# Altium footprint library EwgConnectors.PcbLib: 125 footprints (part 1 of 8)
Each footprint in its own frame and in the unit in brackets; x right, y up, seen from the top. Pads: shape width x height; smd on the part's side, far side on the other; paste and mask are expansions set on the pad; w line width, h text height; cw(c..) or ccw(c..) is an arc to the next point about the centre after c.
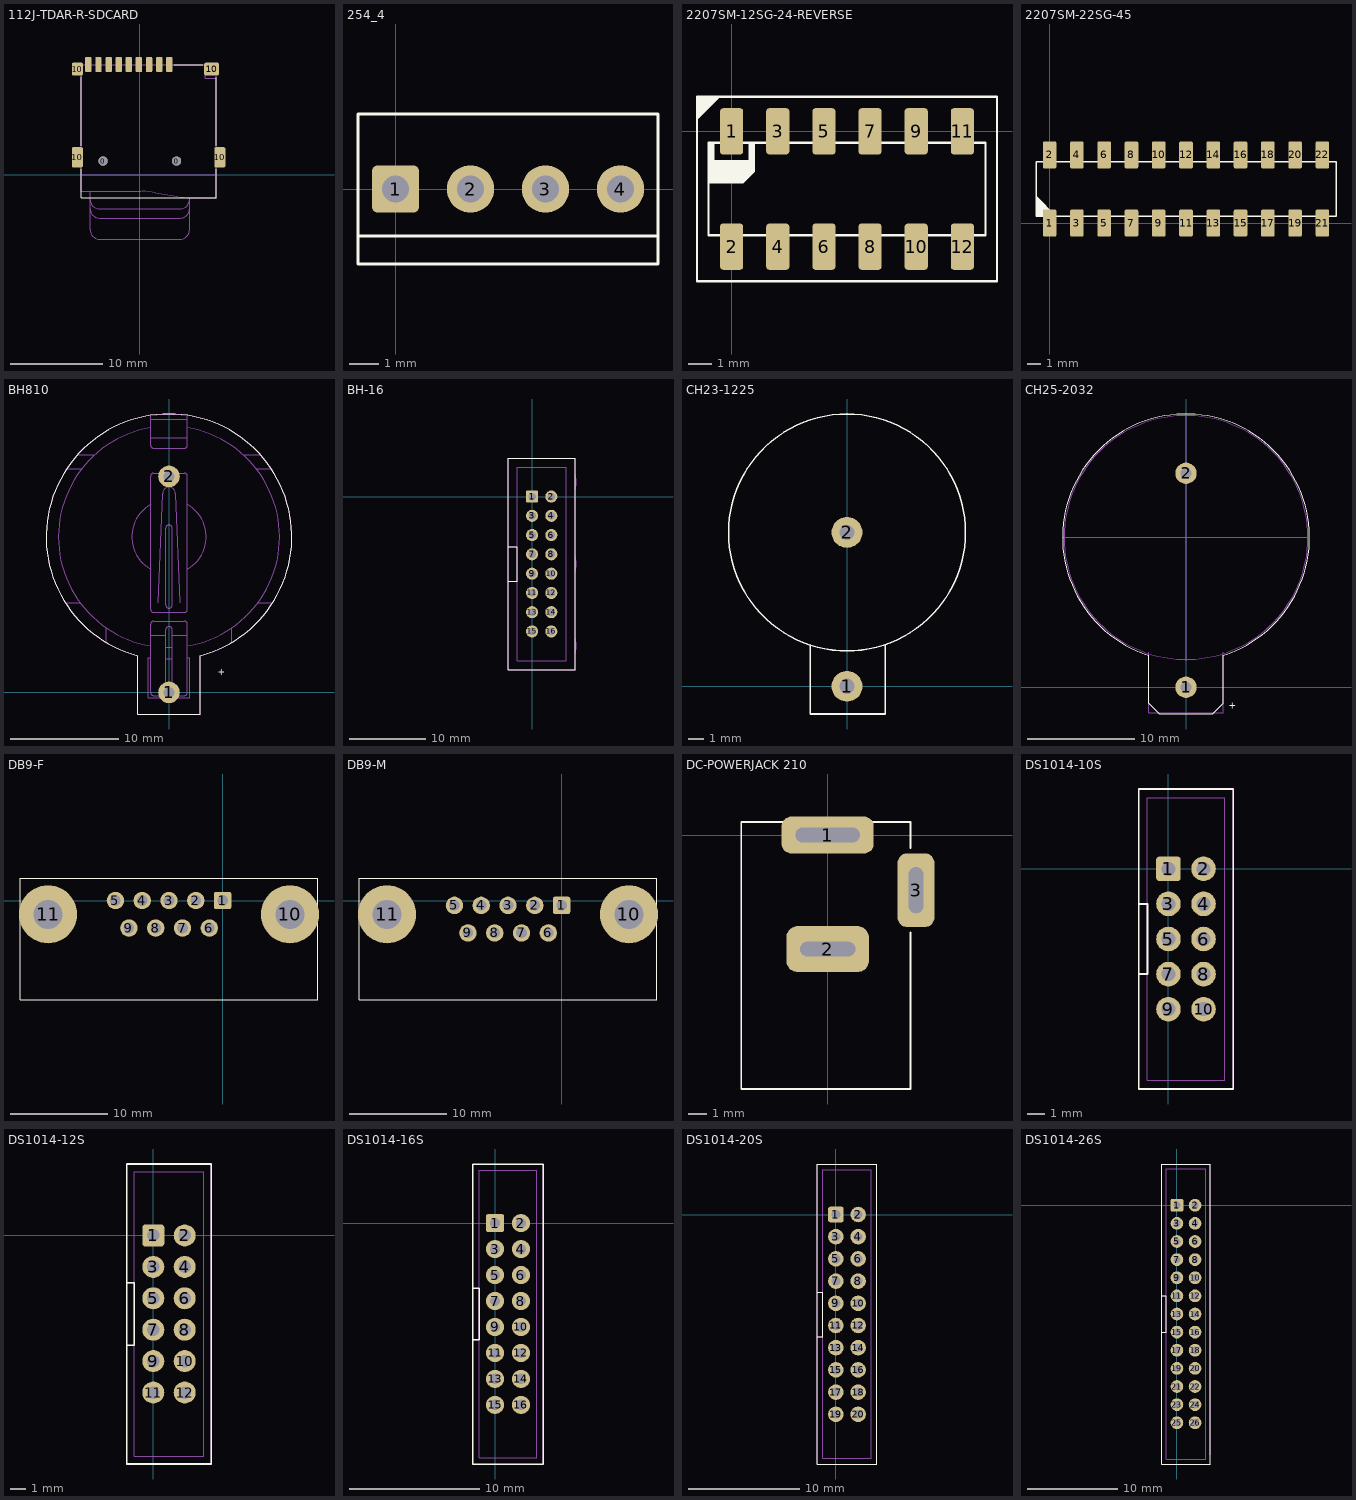
[diagram p0: the footprints below, top view; thin cyan lines are the x and y axes]

## 112J-TDAR-R-SDCARD [mm]
pads (15):
  round 1 hole 1 unplated: 0(-4,1.5) 0(4,1.5)
  rrect25% 0.7x1.6 smd: 1(3.2,12) 2(2.1,12) 3(1,12) 4(-0.1,12) 5(-1.2,12) 6(-2.3,12) 7(-3.4,12) 8(-4.5,12) 9(-5.6,12)
  rrect25% 1.2x2.2 smd: 10(-6.8,1.9) 10(8.7,1.9)
  rrect25% 1.2x1.4 smd: 10(-6.8,11.5)
  rrect25% 1.6x1.4 smd: 10(7.8,11.5)
Top Overlay:
  lines w0.1: -6.4,0.65 -6.4,-2.5 8.3,-2.5 8.3,0.65 ; -6.4,3.15 -6.4,10.65 ; 3.7,12 6.85,12 ; 8.3,3.15 8.3,10.65
Mechanical 1:
  lines w0.005: -6.4,0 8.3,0
  lines w0.05: -6.6,11 -6.6,12 ; -6.45,0 -6.4,0 -6.4,-1.8 ; -6.4,1.1 -7.1,1.1 -7.1,1.9 -7.1,2.7 -6.4,2.7 ; -6.4,11 -7.1,11 -7.1,12 -6.4,12 ; -5.75,12 -5.75,12.5 -5.45,12.5 -5.45,12 -5.6,12 ; -5.4,-3.7 ccw(c-4.4,-3.7) -4.4,-4.7 4.4,-4.7 ccw(c4.4,-3.7) 5.4,-3.7 ; -5.4,-2.65 -5.4,-6 ccw(c-4.4,-6) -4.4,-7 0,-7 4.4,-7 ccw(c4.4,-6) 5.4,-6 5.4,-2.65 ; -4.65,12 -4.65,12.5 -4.35,12.5 -4.35,12 -4.5,12 ; -3.55,12 -3.55,12.5 -3.25,12.5 -3.25,12 -3.4,12 ; -2.45,12 -2.45,12.5 -2.15,12.5 -2.15,12 -2.3,12 ; -1.35,12 -1.35,12.5 -1.05,12.5 -1.05,12 -1.2,12 ; -0.25,12 -0.25,12.5 0.05,12.5 0.05,12 -0.1,12 ; 0.1,-1.8 -6.4,-1.8 ; 0.2,-1.8 cw(c0.205,-9.83) 1.75,-1.95 4,-2.35 ccw(c5.603,6.137) 5.6,-2.5 8.3,-2.5 8.3,10.5 7.1,10.5 7.1,11 ; 0.85,12 0.85,12.5 1.15,12.5 1.15,12 1,12 ; 0.95,12.5 0.95,12 ; 1.95,12 1.95,12.5 2.25,12.5 2.25,12 2.1,12 ; 3.05,12 3.05,12.5 3.35,12.5 3.35,12 3.2,12 ; 5.4,-2.5 5.4,-2.7 cw(c4.4,-2.7) 4.4,-3.7 -4.4,-3.7 cw(c-4.4,-2.7) -5.4,-2.7 -5.4,-2.5 -5.4,-1.8 -6.4,-1.8 ; 7.1,12 7.1,11 ; 7.35,11 7.35,12 ; 8.3,1.1 9,1.1 9,1.9 9,2.7 8.3,2.7 ; -6.4,-1.8 -6.4,12 ; -6.4,12 0.95,12 ; 0.95,12 8.3,12 8.3,11 7.1,11
3D body: height 1.85, standoff 0, extent -7.4,-2.525 9.3,12.275

## 254_4 [mm]
pads (4):
  rrect25% 1.6x1.6 hole 0.9: 1(0,0)
  round 1.6 hole 0.9: 2(2.54,0) 3(5.08,0) 4(7.62,0)
Top Overlay:
  lines w0.1: -1.27,-1.587 8.89,-1.587 ; -1.27,-2.54 -1.27,2.54 8.89,2.54 8.89,-2.54 -1.27,-2.54
Mechanical 1:
  lines w0.05: -1.27,-1.587 8.89,-1.587 ; -1.27,-2.54 -1.27,2.54 8.89,2.54 8.89,-2.54 -1.27,-2.54 ; -0.318,-0.318 -0.318,0.318 0.318,0.318 0.318,-0.318 -0.318,-0.318 ; 2.222,-0.318 2.222,0.318 2.857,0.318 2.857,-0.318 2.222,-0.318 ; 4.763,-0.318 4.763,0.318 5.397,0.318 5.397,-0.318 4.763,-0.318 ; 7.302,-0.318 7.302,0.318 7.938,0.318 7.938,-0.318 7.302,-0.318

## 2207SM-12SG-24-REVERSE [mm]
height 2.4
pads (12):
  rrect25% 1x2 smd: 1(0,0) 2(0,-5) 3(2,0) 4(2,-5) 5(4,0) 6(4,-5) 7(6,0) 8(6,-5) 9(8,0) 10(8,-5) 11(10,0) 12(10,-5)
Top Overlay:
  region: -0.75,-0.5 -0.75,-1.25 0.75,-1.25 0.75,-0.5 1,-0.5 1,-1.75 0.5,-2.25 -1,-2.25 -1,-0.5
  region: -1.5,0.5 -0.5,1.5 -1.5,1.5
  lines w0.1: -1.5,-6.5 -1.5,1.5 11.5,1.5 11.5,-6.5 -1.5,-6.5 ; -1,-4.5 11,-4.5 11,-0.5 -1,-0.5 -1,-4.5
3D body: height 2.4, standoff 0, extent -1,-5.55 11,0.55

## 2207SM-22SG-45 [mm]
height 4.5
pads (22):
  rrect25% 1x2 smd: 1(0,0) 2(0,5) 3(2,0) 4(2,5) 5(4,0) 6(4,5) 7(6,0) 8(6,5) 9(8,0) 10(8,5) 11(10,0) 12(10,5) 13(12,0) 14(12,5) 15(14,0) 16(14,5) 17(16,0) 18(16,5) 19(18,0) 20(18,5) 21(20,0) 22(20,5)
Top Overlay:
  region: -1,0.5 -1,2 0.5,0.5
  lines w0.1: -1,0.5 21,0.5 21,4.5 -1,4.5 -1,0.5
3D body: height 4.5, standoff 0, extent -1.075,-0.55 21.075,5.55

## BH810 [mm]
pads (2):
  round 2 hole 1: 1(0,0) 2(0,20)
Top Overlay:
  lines w0.1: -2.9,-2 -2.9,3.4 cw(c0,14.4) 2.9,3.4 2.9,-2 -2.9,-2
  text "+" at 4.5,1.6 h0.63
Mechanical 1:
  lines w0.05: -9.6,8.3 -8.2,8.3 ; -9.5,20.7 -8.1,20.7 ; -8.5,22 -6.9,22 ; -5.8,4.6 -5.8,6 ; -1.7,3.2 -1.9,3.2 -1.9,-0.5 1.9,-0.5 1.9,3.2 1.7,3.2 ; -1.7,4.3 cw(c0,14.4) -1.7,24.5 ; -1.7,5.3 -0.3,5.3 ; -1.7,11.4 cw(c0,14.4) -1.7,17.4 ; -1.7,23.6 1.7,23.6 ; -1.7,25.3 1.7,25.3 ; -1,8.3 -0.6,18.4 cw(c0,18.4) 0.6,18.4 1,8.3 ; -0.3,3.1 ccw(c0,14.4) 0.3,3.1 ; -0.3,4.2 ccw(c0,14.4) 0.3,4.2 ; 0.3,5.3 1.7,5.3 ; 1.7,4.3 ccw(c0,14.4) 1.7,24.5 ; 1.7,11.4 ccw(c0,14.4) 1.7,17.4 ; 5.8,4.6 5.8,6 ; 6.9,22 8.5,22 ; 8.1,20.7 9.5,20.7 ; 8.2,8.3 9.6,8.3 ; -2.9,-2 0,-2 2.9,-2 2.9,3.4 ccw(c0,14.4) -2.9,3.4 -2.9,-2 ; -1.7,0 ccw(c-1.4,0) -1.4,-0.3 1.4,-0.3 ccw(c1.4,0) 1.7,0 1.7,6.3 ccw(c1.4,6.3) 1.4,6.6 -1.4,6.6 ccw(c-1.4,6.3) -1.7,6.3 -1.7,0 ; -1.7,7.7 ccw(c-1.4,7.7) -1.4,7.4 1.4,7.4 ccw(c1.4,7.7) 1.7,7.7 1.7,20 ccw(c1.4,20) 1.4,20.3 -1.4,20.3 ccw(c-1.4,20) -1.7,20 -1.7,7.7 ; -1.7,22.9 ccw(c-1.4,22.9) -1.4,22.6 1.4,22.6 ccw(c1.4,22.9) 1.7,22.9 1.7,25.6 ccw(c0,14.4) -1.7,25.6 -1.7,22.9 ; -0.3,0.4 ccw(c0,0.4) 0.3,0.4 0.3,5.8 ccw(c0,5.8) -0.3,5.8 -0.3,0.4 ; -0.3,8.1 ccw(c0,8.1) 0.3,8.1 0.3,15.2 ccw(c0,15.2) -0.3,15.2 -0.3,8.1

## BH-16 [mm]
pads (16):
  rrect25% 1.6x1.6 hole 1: 1(0,0)
  round 1.6 hole 1: 2(2.54,0) 3(0,-2.54) 4(2.54,-2.54) 5(0,-5.08) 6(2.54,-5.08) 7(0,-7.62) 8(2.54,-7.62) 9(0,-10.16) 10(2.54,-10.16) 11(0,-12.7) 12(2.54,-12.7) 13(0,-15.24) 14(2.54,-15.24) 15(0,-17.78) 16(2.54,-17.78)
Top Overlay:
  lines w0.1: -3.175,-11.193 -1.984,-11.193 -1.984,-6.589 -3.175,-6.589 ; -3.175,-22.86 -3.175,5.08 5.715,5.08 5.715,-22.86 -3.175,-22.86
Mechanical 1:
  lines w0.05: -3.175,-11.192 -1.984,-11.193 ; -3.175,-6.588 -1.984,-6.589 ; 5.715,-20.955 ccw(c-3.175,-19.685) 5.715,-18.415 ; 5.715,-10.16 ccw(c-3.175,-8.89) 5.715,-7.62 ; 5.715,0.635 ccw(c-3.175,1.905) 5.715,3.175 ; -3.175,-22.86 -3.175,5.08 5.715,5.08 5.715,-22.86 -3.175,-22.86 ; -1.984,-21.671 -1.984,3.89 4.525,3.89 4.525,-21.671 -1.984,-21.671 ; -0.318,-18.098 -0.318,-17.462 0.318,-17.462 0.318,-18.098 -0.318,-18.098 ; -0.318,-15.557 -0.318,-14.922 0.318,-14.922 0.318,-15.557 -0.318,-15.557 ; -0.318,-13.018 -0.318,-12.383 0.318,-12.383 0.318,-13.018 -0.318,-13.018 ; -0.318,-10.477 -0.318,-9.842 0.318,-9.842 0.318,-10.477 -0.318,-10.477 ; -0.318,-7.938 -0.318,-7.302 0.318,-7.302 0.318,-7.938 -0.318,-7.938 ; -0.318,-5.397 -0.318,-4.763 0.318,-4.763 0.318,-5.397 -0.318,-5.397 ; -0.318,-2.857 -0.318,-2.222 0.318,-2.222 0.318,-2.857 -0.318,-2.857 ; -0.318,-0.318 -0.318,0.318 0.318,0.318 0.318,-0.318 -0.318,-0.318 ; 2.222,-18.098 2.222,-17.462 2.857,-17.462 2.857,-18.098 2.222,-18.098 ; 2.222,-15.557 2.857,-15.557 2.857,-14.922 2.222,-14.922 2.222,-15.557 ; 2.222,-13.018 2.222,-12.383 2.857,-12.383 2.857,-13.018 2.222,-13.018 ; 2.222,-10.477 2.857,-10.477 2.857,-9.842 2.222,-9.842 2.222,-10.477 ; 2.222,-7.938 2.857,-7.938 2.857,-7.302 2.222,-7.302 2.222,-7.938 ; 2.222,-5.397 2.857,-5.397 2.857,-4.763 2.222,-4.763 2.222,-5.397 ; 2.222,-2.857 2.222,-2.222 2.857,-2.222 2.857,-2.857 2.222,-2.857 ; 2.222,-0.318 2.857,-0.318 2.857,0.318 2.222,0.318 2.222,-0.318
3D body: height 9.1, standoff -2.65, extent -3.085,-22.86 5.715,5.08

## CH23-1225 [mm]
pads (2):
  round 2 hole 1: 1(0,0) 2(0,10)
Top Overlay:
  circle w0.1: c0,10 r7.701
  lines w0.1: -2.4,2.7 -2.4,-1.8 0.1,-1.8 ; 0,-1.8 2.5,-1.8 2.5,2.7
3D body: height 10.4, standoff -2, extent -7.587,-1.625 7.5,17.425

## CH25-2032 [mm]
pads (2):
  round 2 hole 1: 1(0,0) 2(0,20)
Top Overlay:
  lines w0.1: -3.5,-1.5 -3.5,3 cw(c0,14) 3.5,3 3.5,-1.5 2.5,-2.5 -2.5,-2.5 -3.5,-1.5
  text "+" at 4,-2 h0.63
Mechanical 1:
  circle w0.1: c0,14 r11.4
  lines w0.1: -11.5,14 0,14 ; -3.5,3.25 -3.5,-2.4 0,-2.4 3.5,-2.4 3.5,3.25 ; 0,25.4 0,14 ; 11.4,14 0,14 ; 0,2.5 0,14 ; 0,2.5 0,2.5
3D body: height 8, standoff -3, extent -11.4,-2.4 11.4,25.4

## DB9-F [mm]
pads (11):
  rrect25% 1.8x1.8 hole 1.1: 1(0,0)
  round 1.8 hole 1.1: 2(-2.769,0) 3(-5.537,0) 4(-8.306,0) 5(-11.074,0) 6(-1.372,-2.845) 7(-4.14,-2.845) 8(-6.909,-2.845) 9(-9.677,-2.845)
  round 6 hole 3: 10(6.96,-1.422) 11(-18.034,-1.422)
Top Overlay:
  lines w0.1: -20.904,-10.236 9.83,-10.236 9.83,2.286 -20.904,2.286 -20.904,-10.236
3D body: height 12.55, standoff -3.75, extent -20.905,-17 9.905,2.2

## DB9-M [mm]
pads (11):
  rrect25% 1.8x1.8 hole 1.1: 1(0,-0.5)
  round 1.8 hole 1.1: 2(-2.769,-0.5) 3(-5.537,-0.5) 4(-8.306,-0.5) 5(-11.074,-0.5) 6(-1.372,-3.345) 7(-4.14,-3.345) 8(-6.909,-3.345) 9(-9.677,-3.345)
  round 6 hole 3: 10(6.96,-1.422) 11(-18.034,-1.422)
Top Overlay:
  lines w0.1: -20.904,-10.236 -20.904,2.286 9.83,2.286 9.83,-10.236 -20.904,-10.236
3D body: height 12.55, standoff -3.85, extent -20.75,-16.5 9.75,1.2

## DC-POWERJACK 210 [mm]
pads (3):
  rrect50% 5x2 hole 0.8 slot 3.5 at 0 deg: 1(0,0)
  rrect50% 4.5x2.5 hole 0.8 slot 3 at 0 deg: 2(0,-6.2)
  rrect50% 2x4 hole 0.8 slot 2.5 at 90 deg: 3(4.8,-3)
Top Overlay:
  lines w0.1: 4.5,-5.3 4.5,-13.8 -4.7,-13.8 -4.7,0.7 4.5,0.7 4.5,-0.7
3D body: height 11, standoff -4, extent -4.65,-13.8 5.15,0.7

## DS1014-10S [mm]
pads (10):
  rrect25% 1.4x1.4 hole 0.8: 1(0,0)
  round 1.4 hole 0.8: 2(2,0) 3(0,-2) 4(2,-2) 5(0,-4) 6(2,-4) 7(0,-6) 8(2,-6) 9(0,-8) 10(2,-8)
Top Overlay:
  lines w0.1: -1.7,-6 -1.2,-6 -1.2,-2 -1.7,-2 ; -1.7,-12.55 -1.7,4.55 3.7,4.55 3.7,-12.55 -1.7,-12.55
Mechanical 1:
  lines w0.05: -1.7,-6 -1.2,-6 ; -1.7,-2 -1.2,-2 ; -1.7,-12.55 -1.7,4.55 3.7,4.55 3.7,-12.55 -1.7,-12.55 ; -1.2,-12.05 -1.2,4.05 3.2,4.05 3.2,-12.05 -1.2,-12.05 ; -0.25,-8.25 -0.25,-7.75 0.25,-7.75 0.25,-8.25 -0.25,-8.25 ; -0.25,-6.25 -0.25,-5.75 0.25,-5.75 0.25,-6.25 -0.25,-6.25 ; -0.25,-4.25 -0.25,-3.75 0.25,-3.75 0.25,-4.25 -0.25,-4.25 ; -0.25,-2.25 -0.25,-1.75 0.25,-1.75 0.25,-2.25 -0.25,-2.25 ; -0.25,-0.25 -0.25,0.25 0.25,0.25 0.25,-0.25 -0.25,-0.25 ; 1.75,-8.25 1.75,-7.75 2.25,-7.75 2.25,-8.25 1.75,-8.25 ; 1.75,-6.25 1.75,-5.75 2.25,-5.75 2.25,-6.25 1.75,-6.25 ; 1.75,-4.25 1.75,-3.75 2.25,-3.75 2.25,-4.25 1.75,-4.25 ; 1.75,-2.25 1.75,-1.75 2.25,-1.75 2.25,-2.25 1.75,-2.25 ; 1.75,-0.25 2.25,-0.25 2.25,0.25 1.75,0.25 1.75,-0.25
3D body: height 5.65, standoff -3, extent -1.675,-12.5 3.775,4.5

## DS1014-12S [mm]
pads (12):
  rrect25% 1.4x1.4 hole 0.8: 1(0,0)
  round 1.4 hole 0.8: 2(2,0) 3(0,-2) 4(2,-2) 5(0,-4) 6(2,-4) 7(0,-6) 8(2,-6) 9(0,-8) 10(2,-8) 11(0,-10) 12(2,-10)
Top Overlay:
  lines w0.1: -1.7,-7 -1.2,-7 -1.2,-3 -1.7,-3 ; -1.7,-14.55 3.7,-14.55 3.7,4.55 -1.7,4.55 -1.7,-14.55
Mechanical 1:
  lines w0.05: -1.7,-7 -1.2,-7 ; -1.7,-3 -1.2,-3 ; -1.7,-14.55 3.7,-14.55 3.7,4.55 -1.7,4.55 -1.7,-14.55 ; -1.2,-14.05 3.2,-14.05 3.2,4.05 -1.2,4.05 -1.2,-14.05 ; -0.25,-10.25 -0.25,-9.75 0.25,-9.75 0.25,-10.25 -0.25,-10.25 ; -0.25,-8.25 0.25,-8.25 0.25,-7.75 -0.25,-7.75 -0.25,-8.25 ; -0.25,-6.25 0.25,-6.25 0.25,-5.75 -0.25,-5.75 -0.25,-6.25 ; -0.25,-4.25 0.25,-4.25 0.25,-3.75 -0.25,-3.75 -0.25,-4.25 ; -0.25,-2.25 0.25,-2.25 0.25,-1.75 -0.25,-1.75 -0.25,-2.25 ; -0.25,-0.25 0.25,-0.25 0.25,0.25 -0.25,0.25 -0.25,-0.25 ; 1.75,-10.25 1.75,-9.75 2.25,-9.75 2.25,-10.25 1.75,-10.25 ; 1.75,-8.25 2.25,-8.25 2.25,-7.75 1.75,-7.75 1.75,-8.25 ; 1.75,-6.25 2.25,-6.25 2.25,-5.75 1.75,-5.75 1.75,-6.25 ; 1.75,-4.25 2.25,-4.25 2.25,-3.75 1.75,-3.75 1.75,-4.25 ; 1.75,-2.25 2.25,-2.25 2.25,-1.75 1.75,-1.75 1.75,-2.25 ; 1.75,-0.25 1.75,0.25 2.25,0.25 2.25,-0.25 1.75,-0.25
3D body: height 5.65, standoff -3.6, extent -1.675,-14.5 3.775,4.5

## DS1014-16S [mm]
pads (16):
  rrect25% 1.4x1.4 hole 0.8: 1(0,0)
  round 1.4 hole 0.8: 2(2,0) 3(0,-2) 4(2,-2) 5(0,-4) 6(2,-4) 7(0,-6) 8(2,-6) 9(0,-8) 10(2,-8) 11(0,-10) 12(2,-10) 13(0,-12) 14(2,-12) 15(0,-14) 16(2,-14)
Top Overlay:
  lines w0.1: -1.7,-9 -1.2,-9 -1.2,-5 -1.7,-5 ; -1.7,-18.55 -1.7,4.55 3.7,4.55 3.7,-18.55 -1.7,-18.55
Mechanical 1:
  lines w0.05: -1.7,-9 -1.2,-9 ; -1.7,-5 -1.2,-5 ; -1.7,-18.55 -1.7,4.55 3.7,4.55 3.7,-18.55 -1.7,-18.55 ; -1.2,-18.05 -1.2,4.05 3.2,4.05 3.2,-18.05 -1.2,-18.05 ; -0.25,-14.25 -0.25,-13.75 0.25,-13.75 0.25,-14.25 -0.25,-14.25 ; -0.25,-12.25 -0.25,-11.75 0.25,-11.75 0.25,-12.25 -0.25,-12.25 ; -0.25,-10.25 -0.25,-9.75 0.25,-9.75 0.25,-10.25 -0.25,-10.25 ; -0.25,-8.25 -0.25,-7.75 0.25,-7.75 0.25,-8.25 -0.25,-8.25 ; -0.25,-6.25 -0.25,-5.75 0.25,-5.75 0.25,-6.25 -0.25,-6.25 ; -0.25,-4.25 -0.25,-3.75 0.25,-3.75 0.25,-4.25 -0.25,-4.25 ; -0.25,-2.25 -0.25,-1.75 0.25,-1.75 0.25,-2.25 -0.25,-2.25 ; -0.25,-0.25 -0.25,0.25 0.25,0.25 0.25,-0.25 -0.25,-0.25 ; 1.75,-14.25 2.25,-14.25 2.25,-13.75 1.75,-13.75 1.75,-14.25 ; 1.75,-12.25 2.25,-12.25 2.25,-11.75 1.75,-11.75 1.75,-12.25 ; 1.75,-10.25 2.25,-10.25 2.25,-9.75 1.75,-9.75 1.75,-10.25 ; 1.75,-8.25 1.75,-7.75 2.25,-7.75 2.25,-8.25 1.75,-8.25 ; 1.75,-6.25 1.75,-5.75 2.25,-5.75 2.25,-6.25 1.75,-6.25 ; 1.75,-4.25 1.75,-3.75 2.25,-3.75 2.25,-4.25 1.75,-4.25 ; 1.75,-2.25 1.75,-1.75 2.25,-1.75 2.25,-2.25 1.75,-2.25 ; 1.75,-0.25 2.25,-0.25 2.25,0.25 1.75,0.25 1.75,-0.25
3D body: height 5.65, standoff -3, extent -1.725,-18.55 3.725,4.55

## DS1014-20S [mm]
pads (20):
  rrect25% 1.4x1.4 hole 0.8: 1(0,0)
  round 1.4 hole 0.8: 2(2,0) 3(0,-2) 4(2,-2) 5(0,-4) 6(2,-4) 7(0,-6) 8(2,-6) 9(0,-8) 10(2,-8) 11(0,-10) 12(2,-10) 13(0,-12) 14(2,-12) 15(0,-14) 16(2,-14) 17(0,-16) 18(2,-16) 19(0,-18) 20(2,-18)
Top Overlay:
  lines w0.1: -1.7,-11 -1.2,-11 -1.2,-7 -1.7,-7 ; -1.7,-22.479 3.7,-22.479 3.7,4.55 -1.7,4.55 -1.7,-22.479
Mechanical 1:
  lines w0.05: -1.7,-11 -1.2,-11 ; -1.7,-7 -1.2,-7 ; -1.7,-22.479 3.7,-22.479 3.7,4.55 -1.7,4.55 -1.7,-22.479 ; -1.2,-21.971 3.2,-21.971 3.2,4.05 -1.2,4.05 -1.2,-21.971 ; -0.25,-18.25 0.25,-18.25 0.25,-17.75 -0.25,-17.75 -0.25,-18.25 ; -0.25,-16.25 -0.25,-15.75 0.25,-15.75 0.25,-16.25 -0.25,-16.25 ; -0.25,-14.25 0.25,-14.25 0.25,-13.75 -0.25,-13.75 -0.25,-14.25 ; -0.25,-12.25 0.25,-12.25 0.25,-11.75 -0.25,-11.75 -0.25,-12.25 ; -0.25,-10.25 0.25,-10.25 0.25,-9.75 -0.25,-9.75 -0.25,-10.25 ; -0.25,-8.25 0.25,-8.25 0.25,-7.75 -0.25,-7.75 -0.25,-8.25 ; -0.25,-6.25 0.25,-6.25 0.25,-5.75 -0.25,-5.75 -0.25,-6.25 ; -0.25,-4.25 0.25,-4.25 0.25,-3.75 -0.25,-3.75 -0.25,-4.25 ; -0.25,-2.25 0.25,-2.25 0.25,-1.75 -0.25,-1.75 -0.25,-2.25 ; -0.25,-0.25 0.25,-0.25 0.25,0.25 -0.25,0.25 -0.25,-0.25 ; 1.75,-18.25 1.75,-17.75 2.25,-17.75 2.25,-18.25 1.75,-18.25 ; 1.75,-16.25 2.25,-16.25 2.25,-15.75 1.75,-15.75 1.75,-16.25 ; 1.75,-14.25 1.75,-13.75 2.25,-13.75 2.25,-14.25 1.75,-14.25 ; 1.75,-12.25 1.75,-11.75 2.25,-11.75 2.25,-12.25 1.75,-12.25 ; 1.75,-10.25 1.75,-9.75 2.25,-9.75 2.25,-10.25 1.75,-10.25 ; 1.75,-8.25 2.25,-8.25 2.25,-7.75 1.75,-7.75 1.75,-8.25 ; 1.75,-6.25 2.25,-6.25 2.25,-5.75 1.75,-5.75 1.75,-6.25 ; 1.75,-4.25 2.25,-4.25 2.25,-3.75 1.75,-3.75 1.75,-4.25 ; 1.75,-2.25 2.25,-2.25 2.25,-1.75 1.75,-1.75 1.75,-2.25 ; 1.75,-0.25 1.75,0.25 2.25,0.25 2.25,-0.25 1.75,-0.25
3D body: height 5.65, standoff -3.6, extent -1.725,-22.45 3.725,4.55

## DS1014-26S [mm]
pads (26):
  rrect25% 1.4x1.4 hole 0.8: 1(0,0)
  round 1.4 hole 0.8: 2(2,0) 3(0,-2) 4(2,-2) 5(0,-4) 6(2,-4) 7(0,-6) 8(2,-6) 9(0,-8) 10(2,-8) 11(0,-10) 12(2,-10) 13(0,-12) 14(2,-12) 15(0,-14) 16(2,-14) 17(0,-16) 18(2,-16) 19(0,-18) 20(2,-18) 21(0,-20) 22(2,-20) 23(0,-22) 24(2,-22) 25(0,-24) 26(2,-24)
Top Overlay:
  lines w0.1: -1.7,-14 -1.2,-14 -1.2,-10 -1.7,-10 ; -1.7,-28.55 3.7,-28.55 3.7,4.55 -1.7,4.55 -1.7,-28.55
Mechanical 1:
  lines w0.05: -1.7,-14 -1.2,-14 ; -1.7,-10 -1.2,-10 ; 3.7,-28.55 -1.7,-28.55 -1.7,4.55 3.7,4.55 3.7,-27.55 ; -1.2,-28.05 3.2,-28.05 3.2,4.05 -1.2,4.05 -1.2,-28.05 ; -0.25,-24.25 0.25,-24.25 0.25,-23.75 -0.25,-23.75 -0.25,-24.25 ; -0.25,-22.25 0.25,-22.25 0.25,-21.75 -0.25,-21.75 -0.25,-22.25 ; -0.25,-20.25 0.25,-20.25 0.25,-19.75 -0.25,-19.75 -0.25,-20.25 ; -0.25,-18.25 0.25,-18.25 0.25,-17.75 -0.25,-17.75 -0.25,-18.25 ; -0.25,-16.25 0.25,-16.25 0.25,-15.75 -0.25,-15.75 -0.25,-16.25 ; -0.25,-14.25 0.25,-14.25 0.25,-13.75 -0.25,-13.75 -0.25,-14.25 ; -0.25,-12.25 0.25,-12.25 0.25,-11.75 -0.25,-11.75 -0.25,-12.25 ; -0.25,-10.25 0.25,-10.25 0.25,-9.75 -0.25,-9.75 -0.25,-10.25 ; -0.25,-8.25 0.25,-8.25 0.25,-7.75 -0.25,-7.75 -0.25,-8.25 ; -0.25,-6.25 0.25,-6.25 0.25,-5.75 -0.25,-5.75 -0.25,-6.25 ; -0.25,-4.25 0.25,-4.25 0.25,-3.75 -0.25,-3.75 -0.25,-4.25 ; -0.25,-2.25 0.25,-2.25 0.25,-1.75 -0.25,-1.75 -0.25,-2.25 ; -0.25,-0.25 0.25,-0.25 0.25,0.25 -0.25,0.25 -0.25,-0.25 ; 1.75,-24.25 2.25,-24.25 2.25,-23.75 1.75,-23.75 1.75,-24.25 ; 1.75,-22.25 2.25,-22.25 2.25,-21.75 1.75,-21.75 1.75,-22.25 ; 1.75,-20.25 2.25,-20.25 2.25,-19.75 1.75,-19.75 1.75,-20.25 ; 1.75,-18.25 2.25,-18.25 2.25,-17.75 1.75,-17.75 1.75,-18.25 ; 1.75,-16.25 2.25,-16.25 2.25,-15.75 1.75,-15.75 1.75,-16.25 ; 1.75,-14.25 2.25,-14.25 2.25,-13.75 1.75,-13.75 1.75,-14.25 ; 1.75,-12.25 2.25,-12.25 2.25,-11.75 1.75,-11.75 1.75,-12.25 ; 1.75,-10.25 2.25,-10.25 2.25,-9.75 1.75,-9.75 1.75,-10.25 ; 1.75,-8.25 2.25,-8.25 2.25,-7.75 1.75,-7.75 1.75,-8.25 ; 1.75,-6.25 2.25,-6.25 2.25,-5.75 1.75,-5.75 1.75,-6.25 ; 1.75,-4.25 2.25,-4.25 2.25,-3.75 1.75,-3.75 1.75,-4.25 ; 1.75,-2.25 2.25,-2.25 2.25,-1.75 1.75,-1.75 1.75,-2.25 ; 1.75,-0.25 1.75,0.25 2.25,0.25 2.25,-0.25 1.75,-0.25
3D body: height 5.75, standoff -2.8, extent -1.775,-28.5 3.725,4.5